# Altium footprint library CADTcommon.PcbLib: 503 footprints (part 16 of 32)
Each footprint in its own frame and in the unit in brackets; x right, y up, seen from the top. Pads: shape width x height; smd on the part's side, far side on the other; paste and mask are expansions set on the pad; w line width, h text height; cw(c..) or ccw(c..) is an arc to the next point about the centre after c.
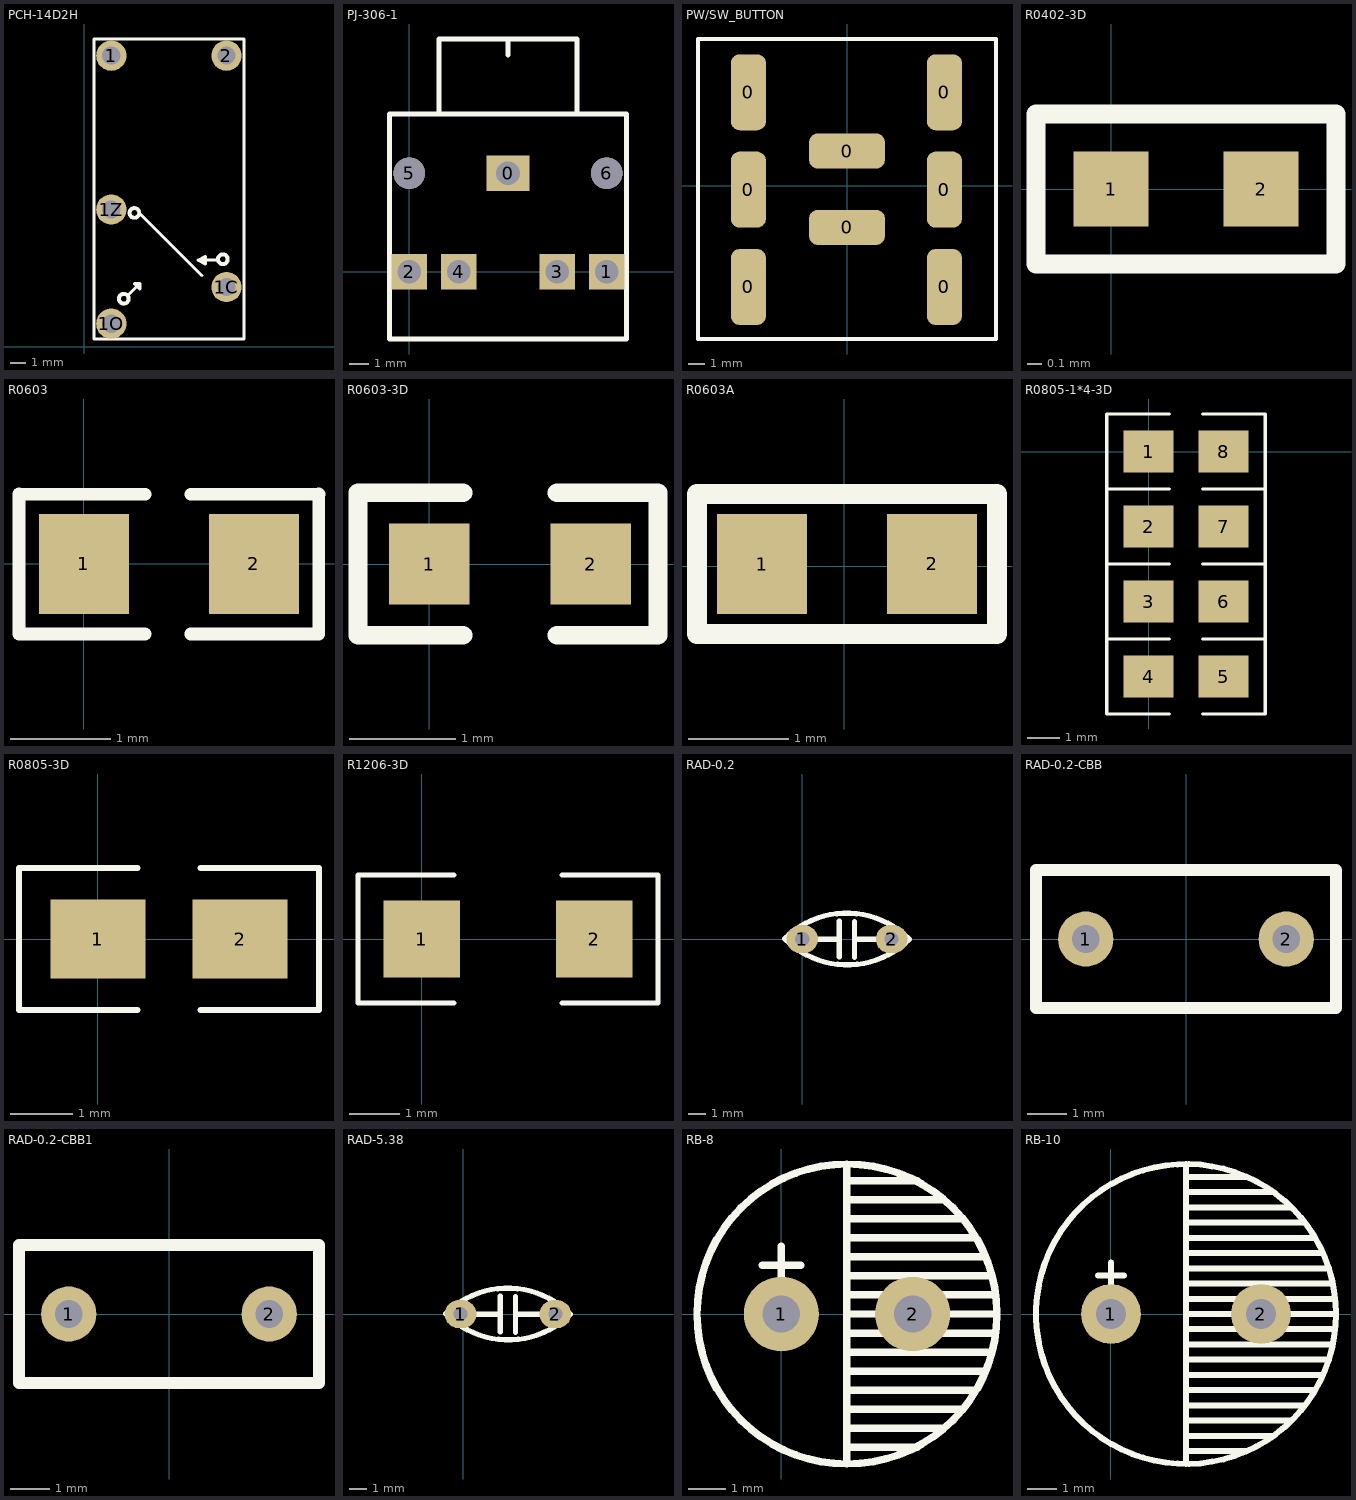
[diagram p15: the footprints below, top view; thin cyan lines are the x and y axes]

## PCH-14D2H [mm]
pads (5):
  round 2 hole 1.2: 1(1.778,19.22) 1C(9.385,3.937) 1O(1.778,1.52) 1Z(1.778,9.06) 2(9.385,19.22)
Top Overlay:
  circle w0.254: c9.144,5.775 r0.321
  circle w0.254: c2.599,3.167 r0.321
  circle w0.254: c3.303,8.832 r0.321
  lines w0.2: 0.635,0.52 0.635,20.32 10.535,20.32 ; 0.641,0.508 10.541,0.508 ; 2.85,3.358 3.675,4.183 ; 3.624,8.832 7.752,4.704 ; 8.763,5.715 7.493,5.715 ; 10.541,0.52 10.541,20.32 ; 3.675,4.183 3.294,4.183 3.675,3.802 3.675,4.183 ; 7.493,5.715 8.001,5.461 8.001,5.969 7.493,5.715

## PJ-306-1 [mm]
pads (7):
  rect 2.2x1.8 hole 1.2: 0(5,5)
  rect 1.8x1.8 hole 1.2: 1(10,0) 2(0,0) 3(7.5,0) 4(2.5,0)
  round 1.6 hole 1.6 unplated: 5(0,5) 6(10,5)
Top Overlay:
  lines w0.254: 1.5,8 1.5,11.8 8.4,11.8 ; 5,11 5,11.8 ; 8.5,8 8.5,11.8 ; -1,-3.4 -1,8 11,8 11,-3.4 -1,-3.4
3D body: height 3.2, standoff -10.8, extent -1.041,-3.689 11.059,11.411

## PW/SW_BUTTON [mm]
pads (8):
  rrect50% 2.13x4.6 all layers, no hole: 0(-5.969,-6.121) 0(-5.969,-0.229) 0(-5.969,5.664) 0(5.893,-6.121) 0(5.893,-0.229) 0(5.893,5.664)
  rrect50% 4.6x2.13 all layers, no hole: 0(0,-2.515) 0(0,2.108)
Top Overlay:
  lines w0.254: -9.017,-9.271 9.017,-9.271 9.017,8.89 -9.017,8.89 -9.017,-9.271
Mechanical 1:
  lines w0.254: -6.426,-7.899 -5.486,-7.899 -5.486,-4.293 -6.426,-4.293 -6.426,-7.899 ; -6.426,-2.007 -5.486,-2.007 -5.486,1.6 -6.426,1.6 -6.426,-2.007 ; -6.426,3.886 -6.426,7.493 -5.486,7.493 -5.486,3.886 -6.426,3.886 ; -1.829,1.651 1.778,1.651 1.778,2.591 -1.829,2.591 -1.829,1.651 ; -1.778,-2.997 -1.778,-2.057 1.829,-2.057 1.829,-2.997 -1.778,-2.997 ; 5.436,-7.899 6.375,-7.899 6.375,-4.293 5.436,-4.293 5.436,-7.899 ; 5.436,-2.007 6.375,-2.007 6.375,1.6 5.436,1.6 5.436,-2.007 ; 5.436,3.886 6.375,3.886 6.375,7.493 5.436,7.493 5.436,3.886

## R0402-3D [mil]
pads (2):
  rect 20x20 smd: 1(0,0) 2(40,0)
Top Overlay:
  lines w5: -20,-20 60,-20 60,20 -20,20 -20,-20
3D body: height 13.78, standoff 0, extent 0.32,-10 39.69,9.69

## R0603 [mm]
pads (2):
  rect 0.9x1 smd: 1(0,0) 2(1.7,0)
Top Overlay:
  lines w0.127: -0.65,-0.7 -0.65,0.7 ; -0.649,0.696 0.61,0.696 ; -0.624,-0.701 0.61,-0.701 ; 1.067,-0.701 2.35,-0.701 2.35,0.7 ; 1.067,0.696 2.351,0.696
3D body: height 0.3, standoff 0, extent 0.089,-0.4 1.689,0.4

## R0603-3D [mil]
pads (2):
  rect 30x30 smd: 1(0,0) 2(60,0)
Top Overlay:
  lines w7: -26.5,26.5 -26.5,-26.5 12.5,-26.5 ; -25,26.5 12.5,26.5 ; 47.5,-26.5 85,-26.5 85,26.5 47.5,26.5
3D body: height 17.72, standoff 0, extent -1,-16 61.99,15.5

## R0603A [mm] "0603A"
pads (2):
  rect 0.9x1 smd: 1(-0.821,0.021) 2(0.879,0.021)
Top Overlay:
  lines w0.2: -1.471,-0.679 -1.471,0.721 1.529,0.721 1.529,-0.679 -1.471,-0.679

## R0805-1*4-3D [mil]
pads (8):
  rect 60x50 smd: 1(0,0) 2(0,-90) 3(0,-180) 4(0,-270) 5(90,-270) 6(90,-180) 7(90,-90) 8(90,0)
Top Overlay:
  lines w3.94: 25,-315 -50,-315 -50,-225 ; 25,45 -50,45 -50,-45 ; 65,-315 140,-315 140,-225 ; 65,45 140,45 140,-45 ; -50,-225 25,-225 -50,-225 ; -50,-225 -50,-135 ; -50,-135 25,-135 -50,-135 ; -50,-135 -50,-45 ; -50,-45 25,-45 -50,-45 ; 140,-225 65,-225 140,-225 ; 140,-225 140,-135 ; 140,-135 65,-135 140,-135 ; 140,-135 140,-45 ; 140,-45 65,-45 140,-45
3D body: height 21.65, standoff 0, extent 6,-295 84.74,-245.39
3D body: height 21.65, standoff 0, extent 6,-205 84.74,-155.39
3D body: height 21.65, standoff 0, extent 6,-115 84.74,-65.39
3D body: height 21.65, standoff 0, extent 6,-25 84.74,24.61

## R0805-3D [mil]
pads (2):
  rect 60x50 smd: 1(0,0) 2(90,0)
Top Overlay:
  lines w3.94: 25,-45 -50,-45 -50,45 25,45 ; 65,-45 140,-45 140,45 65,45
3D body: height 21.65, standoff 0, extent 6,-25 84.74,24.61

## R1206-3D [mil]
pads (2):
  rect 60x60 smd: 1(0,0) 2(135,0)
Top Overlay:
  lines w3.94: 25,-50 -50,-50 -50,50 25,50 ; 110,-50 185,-50 185,50 110,50
3D body: height 23.62, standoff 0, extent 5,-31 130.98,31.99

## RAD-0.2 [mm]
pads (2):
  oval 1.8x1.6 hole 0.8: 1(0,0) 2(5.08,0)
Top Overlay:
  lines w0.3: -1.008,0.02 cw(c2.528,-3.516) 6.063,0.02 ; -0.975,0 ccw(c2.56,3.536) 6.096,0 ; 0,0 2.032,0 ; 2.108,-1.016 2.108,1.016 ; 2.976,-1.041 2.976,0.991 ; 2.976,0 5.08,0
Bottom Overlay:
  lines w0.3: 1.016,0 2.032,0 ; 2.108,-1.016 2.108,1.016 ; 2.976,-1.041 2.976,0.991 ; 2.976,0 4.03,0
3D body: height 4.16, standoff -9.03, extent -1.486,-1.173 6.515,1.219

## RAD-0.2-CBB [mm]
pads (2):
  round 1.4 hole 0.7: 1(-2.54,0) 2(2.54,0)
Top Overlay:
  lines w0.305: -3.8,-1.75 -3.8,1.75 3.8,1.75 3.8,-1.75 -3.8,-1.75
3D body: height 8.11, standoff -4.09, extent -3.699,-1.245 3.801,1.255

## RAD-0.2-CBB1 [mm]
pads (2):
  round 1.4 hole 0.7: 1(-2.54,0) 2(2.54,0)
Top Overlay:
  lines w0.305: -3.8,-1.75 3.8,-1.75 3.8,1.75 -3.8,1.75 -3.8,-1.75
3D body: height 1.5, standoff -7.5, extent -3.6,-1.219 3.6,1.281

## RAD-5.38 [mm]
pads (2):
  oval 1.8x1.6 hole 0.8: 1(-0.152,0) 2(5.232,0)
Top Overlay:
  lines w0.3: -1.008,0.02 cw(c2.528,-3.516) 6.063,0.02 ; -0.975,0 ccw(c2.56,3.536) 6.096,0 ; 0,0 2.032,0 ; 2.108,-1.016 2.108,1.016 ; 2.976,-1.041 2.976,0.991 ; 2.976,0 5.08,0
Bottom Overlay:
  lines w0.3: 1.016,0 2.032,0 ; 2.108,-1.016 2.108,1.016 ; 2.976,-1.041 2.976,0.991 ; 2.976,0 4.03,0
3D body: height 4.16, standoff -9.03, extent -1.486,-1.173 6.515,1.219

## RB-8 [mm]
pads (2):
  round 2 hole 1: 1(0,0) 2(3.5,0)
Top Overlay:
  circle w0.2: c1.75,0 r4
  lines w0.2: -0.505,1.295 0.511,1.295 ; 0.003,0.787 0.003,1.803 ; 1.75,-4 1.75,4 ; 1.75,-3.556 3.617,-3.556 ; 1.75,-3.048 4.329,-3.048 ; 1.75,-2.54 4.786,-2.54 ; 1.75,-2.032 5.167,-2.032 ; 1.75,-1.524 5.421,-1.524 ; 1.75,-1.016 5.599,-1.016 ; 1.75,-0.508 5.675,-0.508 ; 1.75,0 5.75,0 ; 1.75,0.508 5.675,0.508 ; 1.75,1.016 5.599,1.016 ; 1.75,1.524 5.421,1.524 ; 1.75,2.032 5.167,2.032 ; 1.75,2.54 4.786,2.54 ; 1.75,3.048 4.329,3.048 ; 1.75,3.556 3.617,3.556

## RB-10 [mm]
pads (2):
  round 2 hole 1: 1(0,0) 2(5,0)
Top Overlay:
  circle w0.2: c2.5,0 r5
  lines w0.2: -0.437,1.277 0.426,1.277 ; -0.005,0.845 -0.005,1.708 ; 2.5,-5 2.5,5 ; 2.5,-4.572 4.51,-4.572 ; 2.5,-4.064 5.374,-4.064 ; 2.5,-3.556 6.009,-3.556 ; 2.5,-3.048 6.441,-3.048 ; 2.5,-2.54 6.771,-2.54 ; 2.5,-2.032 7.025,-2.032 ; 2.5,-1.524 7.228,-1.524 ; 2.5,-1.016 7.355,-1.016 ; 2.5,-0.508 7.431,-0.508 ; 2.5,0 7.5,0 ; 2.5,0.508 7.431,0.508 ; 2.5,1.016 7.355,1.016 ; 2.5,1.524 7.228,1.524 ; 2.5,2.032 7.025,2.032 ; 2.5,2.54 6.771,2.54 ; 2.5,3.048 6.441,3.048 ; 2.5,3.556 6.009,3.556 ; 2.5,4.064 5.374,4.064 ; 2.5,4.572 4.51,4.572